# Altium footprint library Horizontal Shielded Modular Jack.PcbLib: 23 footprints (part 2 of 2)
Each footprint in its own frame and in the unit in brackets; x right, y up, seen from the top. Pads: shape width x height; smd on the part's side, far side on the other; paste and mask are expansions set on the pad; w line width, h text height; cw(c..) or ccw(c..) is an arc to the next point about the centre after c.
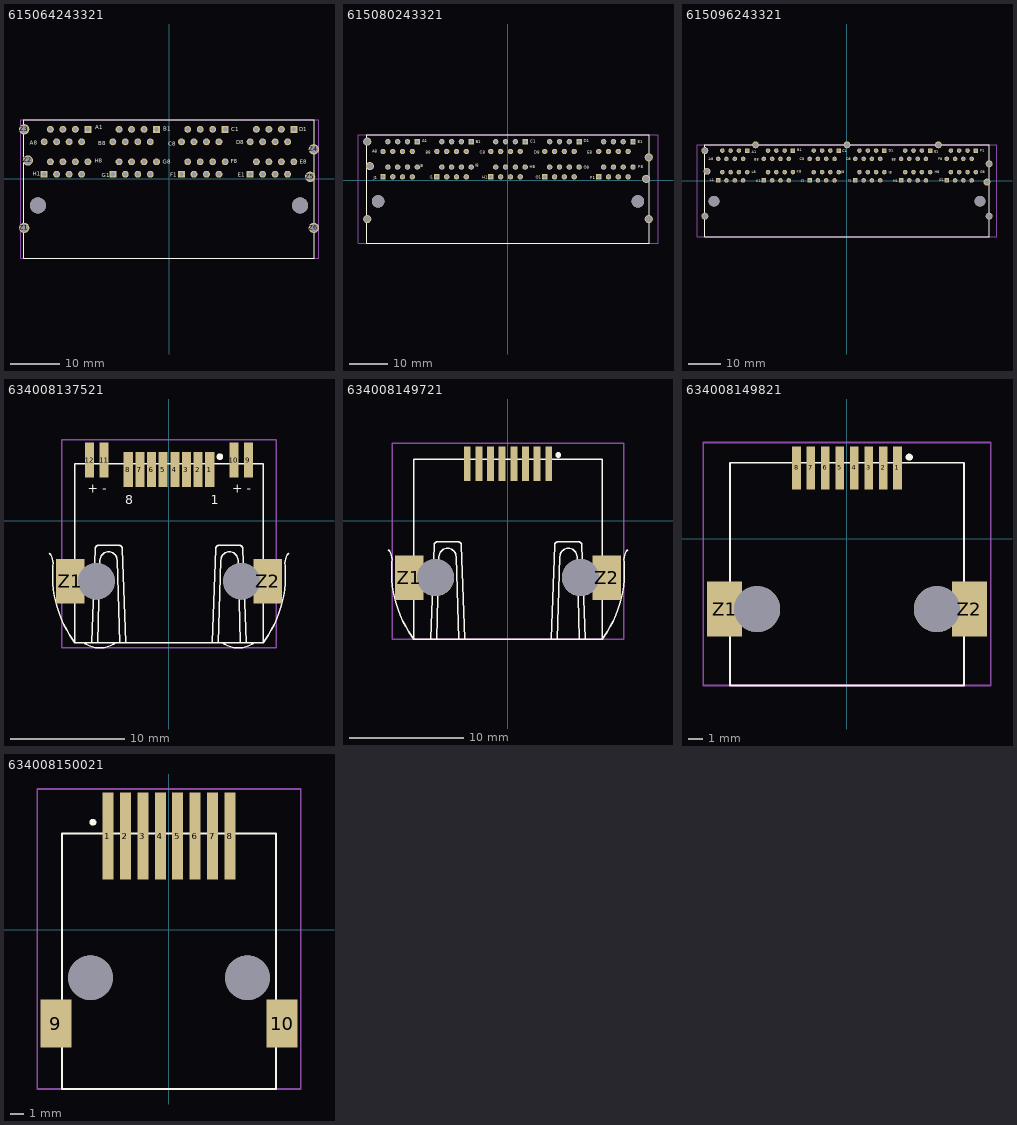
[diagram p1: the footprints below, top view; thin cyan lines are the x and y axes]

## 615064243321 [mm] "Horizontal Shielded 2x4 TH  EMI  fingers  8P8C Tab Down & Up"
height 25.3
pads (72):
  rect 1.4x1.4 hole 0.9: A1(-16.51,10.025) B1(-2.54,10.025) C1(11.43,10.025) D1(25.4,10.025) E1(16.51,0.885) F1(2.54,0.885) G1(-11.43,0.885) H1(-25.4,0.885)
  round 1.4 hole 0.9: A2(-17.78,7.485) A3(-19.05,10.025) A4(-20.32,7.485) A5(-21.59,10.025) A6(-22.86,7.485) A7(-24.13,10.025) A8(-25.4,7.485) B2(-3.81,7.485) B3(-5.08,10.025) B4(-6.35,7.485) B5(-7.62,10.025) B6(-8.89,7.485) B7(-10.16,10.025) B8(-11.43,7.485) C2(10.16,7.485) C3(8.89,10.025) C4(7.62,7.485) C5(6.35,10.025) C6(5.08,7.485) C7(3.81,10.025) C8(2.54,7.485) D2(24.13,7.485) D3(22.86,10.025) D4(21.59,7.485) D5(20.32,10.025) D6(19.05,7.485) D7(17.78,10.025) D8(16.51,7.485) E2(17.78,3.425) E3(19.05,0.885) E4(20.32,3.425) E5(21.59,0.885) E6(22.86,3.425) E7(24.13,0.885) E8(25.4,3.425) F2(3.81,3.425) F3(5.08,0.885) F4(6.35,3.425) F5(7.62,0.885) F6(8.89,3.425) F7(10.16,0.885) F8(11.43,3.425) G2(-10.16,3.425) G3(-8.89,0.885) G4(-7.62,3.425) G5(-6.35,0.885) G6(-5.08,3.425) G7(-3.81,0.885) G8(-2.54,3.425) H2(-24.13,3.425) H3(-22.86,0.885) H4(-21.59,3.425) H5(-20.32,0.885) H6(-19.05,3.425) H7(-17.78,0.885) H8(-16.51,3.425)
  round 2.1 hole 1.6: Z1(-29.47,-10.035) Z2(-28.71,3.685) Z3(-29.47,10.035) Z4(29.47,5.965) Z5(28.71,0.375) Z6(29.47,-10.035)
  round 3.25 hole 3.25 unplated: ""(-26.67,-5.465) ""(26.67,-5.465)
Top Overlay:
  lines w0.127: -29.6,-16.215 -29.6,11.985 29.6,11.985 29.6,-16.215 -29.6,-16.215
  text "D8" at 13.692,6.993 h0.8
  text "D1" at 26.518,9.611 h0.8
  text "E8" at 26.562,2.978 h0.8
  text "E1" at 13.989,0.404 h0.8
  text "C8" at -0.19,6.696 h0.8
  text "C1" at 12.68,9.666 h0.8
  text "F8" at 12.581,3.121 h0.8
  text "F1" at 0.305,0.36 h0.8
  text "G1" at -13.72,0.305 h0.8
  text "G8" at -1.301,3.022 h0.8
  text "B1" at -1.147,9.765 h0.8
  text "B8" at -14.424,6.795 h0.8
  text "A8" at -28.361,6.85 h0.8
  text "A1" at -15.029,10.018 h0.8
  text "H8" at -15.128,3.275 h0.8
  text "H1" at -27.756,0.613 h0.8
Mechanical 15:
  lines w0.127: -30.147,-16.215 -30.147,11.985 30.507,11.985 30.507,-16.215 -30.147,-16.215
3D body: height 2.92, standoff -27.18, extent -30.147,-16.214 30.507,11.986

## 615080243321 [mm] "Horizontal Shielded 2x5 TH  EMI  fingers  8P8C Tab Down & Up"
height 25.24
pads (88):
  rect 1.39x1.39 hole 0.89: A1(-23.495,10.02) B1(-9.525,10.02) C1(4.445,10.02) D1(18.415,10.02) E1(32.385,10.02) F1(23.495,0.9) G1(9.525,0.9) H1(-4.445,0.9) I1(-18.415,0.9) J1(-32.385,0.9)
  round 1.39 hole 0.89: A2(-24.765,7.48) A3(-26.035,10.02) A4(-27.305,7.48) A5(-28.575,10.02) A6(-29.845,7.48) A7(-31.115,10.02) A8(-32.385,7.48) B2(-10.795,7.48) B3(-12.065,10.02) B4(-13.335,7.48) B5(-14.605,10.02) B6(-15.875,7.48) B7(-17.145,10.02) B8(-18.415,7.48) C2(3.175,7.48) C3(1.905,10.02) C4(0.635,7.48) C5(-0.635,10.02) C6(-1.905,7.48) C7(-3.175,10.02) C8(-4.445,7.48) D2(17.145,7.48) D3(15.875,10.02) D4(14.605,7.48) D5(13.335,10.02) D6(12.065,7.48) D7(10.795,10.02) D8(9.525,7.48) E2(31.115,7.48) E3(29.845,10.02) E4(28.575,7.48) E5(27.305,10.02) E6(26.035,7.48) E7(24.765,10.02) E8(23.495,7.48) F2(24.765,3.44) F3(26.035,0.9) F4(27.305,3.44) F5(28.575,0.9) F6(29.845,3.44) F7(31.115,0.9) F8(32.385,3.44) G2(10.795,3.44) G3(12.065,0.9) G4(13.335,3.44) G5(14.605,0.9) G6(15.875,3.44) G7(17.145,0.9) G8(18.415,3.44) H2(-3.175,3.44) H3(-1.905,0.9) H4(-0.635,3.44) H5(0.635,0.9) H6(1.905,3.44) H7(3.175,0.9) H8(4.445,3.44) I2(-17.145,3.44) I3(-15.875,0.9) I4(-14.605,3.44) I5(-13.335,0.9) I6(-12.065,3.44) I7(-10.795,0.9) I8(-9.525,3.44) J2(-31.115,3.44) J3(-29.845,0.9) J4(-28.575,3.44) J5(-27.305,0.9) J6(-26.035,3.44) J7(-24.765,0.9) J8(-23.495,3.44)
  round 2.1 hole 1.6: Z1(-36.45,-10.02) Z2(-35.775,3.69) Z3(-36.45,10.02) Z4(36.45,5.95) Z5(35.775,0.39) Z6(36.45,-10.02)
  round 3.25 hole 3.25 unplated: ""(-33.655,-5.45) ""(33.655,-5.45)
Top Overlay:
  lines w0.127: -36.535,-16.24 -36.535,11.76 36.535,11.76 36.535,-16.24 -36.535,-16.24
  text "E8" at 20.578,6.85 h0.8
  text "E1" at 33.547,9.622 h0.8
  text "F8" at 33.679,3.198 h0.8
  text "F1" at 21.271,0.239 h0.8
  text "D8" at 6.795,6.85 h0.8
  text "D1" at 19.632,9.809 h0.8
  text "G8" at 19.632,3.011 h0.8
  text "G1" at 7.169,0.426 h0.8
  text "C8" at -7.252,6.916 h0.8
  text "C1" at 5.783,9.688 h0.8
  text "H8" at 5.596,3.077 h0.8
  text "H1" at -6.68,0.371 h0.8
  text "I1" at -20.287,0.426 h0.8
  text "I8" at -8.451,3.583 h0.8
  text "B1" at -8.319,9.622 h0.8
  text "B8" at -21.354,6.85 h0.8
  text "A8" at -35.137,7.103 h0.8
  text "A1" at -22.168,9.875 h0.8
  text "J8" at -22.806,3.396 h0.8
  text "J1" at -34.763,0.305 h0.8
Mechanical 15:
  lines w0.127: -38.846,-16.24 -38.846,11.76 38.848,11.76 38.848,-16.24 -38.846,-16.24
3D body: height 27.55, standoff -3.56, extent -38.846,-16.24 38.848,11.76

## 615096243321 [mm] "Horizontal Shielded 2x6 TH  EMI  fingers  8P8C Tab Down & Up"
height 25.24
pads (107):
  rect 1.39x1.39 hole 0.89: A1(-30.48,9.155) B1(-16.51,9.155) C1(-2.54,9.155) D1(11.43,9.155) E1(25.4,9.155) F1(39.37,9.155) G1(30.48,0.035) H1(16.51,0.035) I1(2.54,0.035) J1(-11.43,0.035) K1(-25.4,0.035) L1(-39.37,0.035)
  round 1.39 hole 0.89: A2(-31.75,6.615) A3(-33.02,9.155) A4(-34.29,6.615) A5(-35.56,9.155) A6(-36.83,6.615) A7(-38.1,9.155) A8(-39.37,6.615) B2(-17.78,6.615) B3(-19.05,9.155) B4(-20.32,6.615) B5(-21.59,9.155) B6(-22.86,6.615) B7(-24.13,9.155) B8(-25.4,6.615) C2(-3.81,6.615) C3(-5.08,9.155) C4(-6.35,6.615) C5(-7.62,9.155) C6(-8.89,6.615) C7(-10.16,9.155) C8(-11.43,6.615) D2(10.16,6.615) D3(8.89,9.155) D4(7.62,6.615) D5(6.35,9.155) D6(5.08,6.615) D7(3.81,9.155) D8(2.54,6.615) E2(24.13,6.615) E3(22.86,9.155) E4(21.59,6.615) E5(20.32,9.155) E6(19.05,6.615) E7(17.78,9.155) E8(16.51,6.615) F2(38.1,6.615) F3(36.83,9.155) F4(35.56,6.615) F5(34.29,9.155) F6(33.02,6.615) F7(31.75,9.155) F8(30.48,6.615) G2(31.75,2.575) G3(33.02,0.035) G4(34.29,2.575) G5(35.56,0.035) G6(36.83,2.575) G7(38.1,0.035) G8(39.37,2.575) H2(17.78,2.575) H3(19.05,0.035) H4(20.32,2.575) H5(21.59,0.035) H6(22.86,2.575) H7(24.13,0.035) H8(25.4,2.575) I2(3.81,2.575) I3(5.08,0.035) I4(6.35,2.575) I5(7.62,0.035) I6(8.89,2.575) I7(10.16,0.035) I8(11.43,2.575) J2(-10.16,2.575) J3(-8.89,0.035) J4(-7.62,2.575) J5(-6.35,0.035) J6(-5.08,2.575) J7(-3.81,0.035) J8(-2.54,2.575) K2(-24.13,2.575) K3(-22.86,0.035) K4(-21.59,2.575) K5(-20.32,0.035) K6(-19.05,2.575) K7(-17.78,0.035) K8(-16.51,2.575) L2(-38.1,2.575) L3(-36.83,0.035) L4(-35.56,2.575) L5(-34.29,0.035) L6(-33.02,2.575) L7(-31.75,0.035) L8(-30.48,2.575)
  round 2.1 hole 1.6: Z1(-43.435,-10.885) Z2(-42.76,2.825) Z3(-43.435,9.155) Z4(-27.94,10.885) Z5(0,10.885) Z6(27.94,10.885) Z7(43.435,5.085) Z8(42.76,-0.475) Z9(43.435,-10.885)
  round 3.25 hole 3.25 unplated: ""(-40.64,-6.315) ""(40.64,-6.315)
Top Overlay:
  lines w0.127: -43.52,-17.115 43.52,-17.115 43.52,10.885 -43.52,10.885 -43.52,-17.115
  text "L1" at -41.935,-0.267 h0.8
  text "L8" at -29.164,2.186 h0.8
  text "A1" at -29.087,8.346 h0.8
  text "A8" at -42.243,6.19 h0.8
  text "B8" at -28.273,6.047 h0.8
  text "B1" at -15.128,8.94 h0.8
  text "K8" at -15.348,2.329 h0.8
  text "K1" at -27.679,-0.564 h0.8
  text "J1" at -14.006,-0.421 h0.8
  text "J8" at -1.752,2.186 h0.8
  text "C1" at -1.378,8.643 h0.8
  text "C8" at -14.38,6.19 h0.8
  text "I1" at 0.327,-0.344 h0.8
  text "I8" at 12.801,2.109 h0.8
  text "D1" at 12.801,8.72 h0.8
  text "D8" at -0.267,6.267 h0.8
  text "H1" at 14.143,-0.564 h0.8
  text "H8" at 26.771,2.186 h0.8
  text "E1" at 26.617,8.423 h0.8
  text "E8" at 13.692,6.047 h0.8
  text "G8" at 40.664,2.186 h0.8
  text "G1" at 28.113,-0.267 h0.8
  text "F1" at 40.741,8.797 h0.8
  text "F8" at 27.816,6.124 h0.8
Mechanical 15:
  lines w0.127: -45.831,-17.105 45.833,-17.105 45.833,10.895 -45.831,10.895 -45.831,-17.105
3D body: height 27.59, standoff -3.52, extent -45.831,-17.105 45.833,10.895

## 634008137521 [mm] "RJ45 Horizontal  Shielded SMT With LED With EMI panel ground Tab up - Tray packaging"
height 13.48
pads (16):
  rect 0.8x3.05 smd: 1(3.57,4.48) 2(2.55,4.48) 3(1.53,4.48) 4(0.51,4.48) 5(-0.51,4.48) 6(-1.53,4.48) 7(-2.55,4.48) 8(-3.57,4.48) 9(6.955,5.3) 10(5.685,5.3) 11(-5.685,5.3) 12(-6.955,5.3)
  rect 2.49x3.89 smd: Z1(-8.66,-5.3) Z2(8.66,-5.3)
  round 3.2 hole 3.2 unplated: ""(-6.35,-5.3) ""(6.35,-5.3)
Top Overlay:
  circle w0.3: c4.459,5.6 r0.141
  lines w0.127: -10.476,-2.854 cw(c-11.648,-3.776) -10.162,-3.902 ccw(c-0.289,-4.783) -8.694,-10.036 -8.275,-10.7 ; -7.48,-10.7 ccw(c-6.066,-8.683) -4.656,-10.704 ; -6.782,-10.653 -6.467,-2.447 ; -6.467,-2.447 cw(c-6.176,-2.458) -6.187,-2.167 -4.368,-2.167 cw(c-4.379,-2.458) -4.088,-2.447 ; -6.257,-10.653 -6.047,-3.461 cw(c-5.295,-3.484) -4.543,-3.461 -4.298,-10.688 ; -4.088,-2.447 -3.773,-10.653 ; 3.773,-10.653 4.088,-2.447 ; 4.088,-2.447 cw(c4.379,-2.458) 4.368,-2.167 6.187,-2.167 cw(c6.176,-2.458) 6.467,-2.447 ; 4.298,-10.688 4.543,-3.461 cw(c5.295,-3.484) 6.048,-3.461 6.257,-10.653 ; 4.656,-10.704 ccw(c6.066,-8.683) 7.48,-10.7 ; 6.467,-2.447 6.782,-10.653 ; 10.476,-2.854 ccw(c11.648,-3.776) 10.162,-3.902 cw(c0.289,-4.783) 8.694,-10.036 8.275,-10.7 ; -8.275,-10.7 -8.275,5 8.275,5 8.275,-10.7 ; -8.275,-10.7 8.275,-10.7
  text "8" at -3.85,1.45 h0.8
  text "1" at 3.65,1.45 h0.8
  text "+" at 5.524,2.444 h0.8
  text "-" at 6.794,2.444 h0.8
  text "-" at -5.846,2.444 h0.8
  text "+" at -7.116,2.444 h0.8
Mechanical 15:
  lines w0.127: -9.4,-11.147 -9.4,7.1 9.4,7.1 9.4,-11.147 -9.4,-11.147
3D body: height 14.6, standoff -1.4, extent -9.4,-11.15 9.4,6.447

## 634008149721 [mm] "WR-MJ_Modular Jack_Tab UP_8P8C  With EMI panel ground"
height 13
pads (12):
  rect 0.61x3.05 smd: 1(3.57,4.99) 2(2.55,4.99) 3(1.53,4.99) 4(0.51,4.99) 5(-0.51,4.99) 6(-1.53,4.99) 7(-2.55,4.99) 8(-3.57,4.99)
  rect 2.5x3.89 smd: Z1(-8.66,-4.99) Z2(8.66,-4.99)
  round 3.25 hole 3.25 unplated: ""(-6.35,-4.99) ""(6.35,-4.99)
Top Overlay:
  circle w0.3: c4.4,5.75 r0.1
  lines w0.127: -10.476,-2.544 cw(c-11.648,-3.466) -10.162,-3.592 ccw(c-0.289,-4.473) -8.694,-9.726 -8.275,-10.39 ; -6.782,-10.343 -6.467,-2.137 cw(c-6.176,-2.148) -6.187,-1.857 -4.368,-1.857 cw(c-4.379,-2.148) -4.088,-2.137 -3.773,-10.343 ; -6.257,-10.343 -6.047,-3.151 cw(c-5.295,-3.174) -4.543,-3.151 -4.298,-10.378 ; 3.773,-10.343 4.088,-2.137 cw(c4.379,-2.148) 4.368,-1.857 6.187,-1.857 cw(c6.176,-2.148) 6.467,-2.137 6.782,-10.343 ; 4.298,-10.378 4.543,-3.151 cw(c5.295,-3.174) 6.047,-3.151 6.257,-10.343 ; 10.476,-2.544 ccw(c11.648,-3.466) 10.162,-3.592 cw(c0.289,-4.473) 8.694,-9.726 8.275,-10.39 ; -8.275,-10.39 -8.275,5.36 8.275,5.36 8.275,-10.39 ; -8.275,-10.39 8.275,-10.39
Mechanical 15:
  lines w0.127: -10.16,-10.39 -10.16,6.79 10.16,6.79 10.16,-10.39 -10.16,-10.39
3D body: height 14.54, standoff -1.3, extent -9.525,-10.39 9.525,6.11

## 634008149821 [mm] "WR-MJ_Modular Jack_Tab UP_8P8C"
height 13
pads (12):
  rect 0.61x3.05 smd: 1(3.57,4.99) 2(2.55,4.99) 3(1.53,4.99) 4(0.51,4.99) 5(-0.51,4.99) 6(-1.53,4.99) 7(-2.55,4.99) 8(-3.57,4.99)
  rect 2.5x3.89 smd: Z1(-8.66,-4.99) Z2(8.66,-4.99)
  round 3.25 hole 3.25 unplated: ""(-6.35,-4.99) ""(6.35,-4.99)
Top Overlay:
  circle w0.3: c4.4,5.75 r0.1
  lines w0.127: -8.275,-10.39 8.275,-10.39 8.275,5.36 -8.275,5.36 -8.275,-10.39
Mechanical 15:
  lines w0.127: -10.16,-10.39 10.16,-10.39 10.16,6.79 -10.16,6.79 -10.16,-10.39
3D body: height 13.5, standoff -1.3, extent -9.525,-10.39 9.525,6.11

## 634008150021 [mm] "WR-MJ_Modular Jack_Tab DOWN_10P8C NULL"
height 11.8
pads (12):
  rect 0.8x6.35 smd: 1(-4.445,6.827) 2(-3.175,6.827) 3(-1.905,6.827) 4(-0.635,6.827) 5(0.635,6.827) 6(1.905,6.827) 7(3.175,6.827) 8(4.445,6.827)
  rect 2.24x3.5 smd: 9(-8.235,-6.827) 10(8.235,-6.827)
  round 3.25 hole 3.25 unplated: ""(-5.715,-3.497) ""(5.715,-3.497)
Top Overlay:
  circle w0.3: c-5.545,7.827 r0.1
  lines w0.127: -7.8,-11.598 -7.8,7.003 7.8,7.003 7.8,-11.598 -7.8,-11.598
Mechanical 15:
  lines w0.127: -9.605,-11.598 -9.605,10.252 9.605,10.252 9.605,-11.598 -9.605,-11.598
3D body: height 11.85, standoff -3.15, extent -9.05,-11.598 9.05,9.252